# Altium footprint library RevA2.PcbLib: 57 footprints (part 2 of 4)
Each footprint in its own frame and in the unit in brackets; x right, y up, seen from the top. Pads: shape width x height; smd on the part's side, far side on the other; paste and mask are expansions set on the pad; w line width, h text height; cw(c..) or ccw(c..) is an arc to the next point about the centre after c.
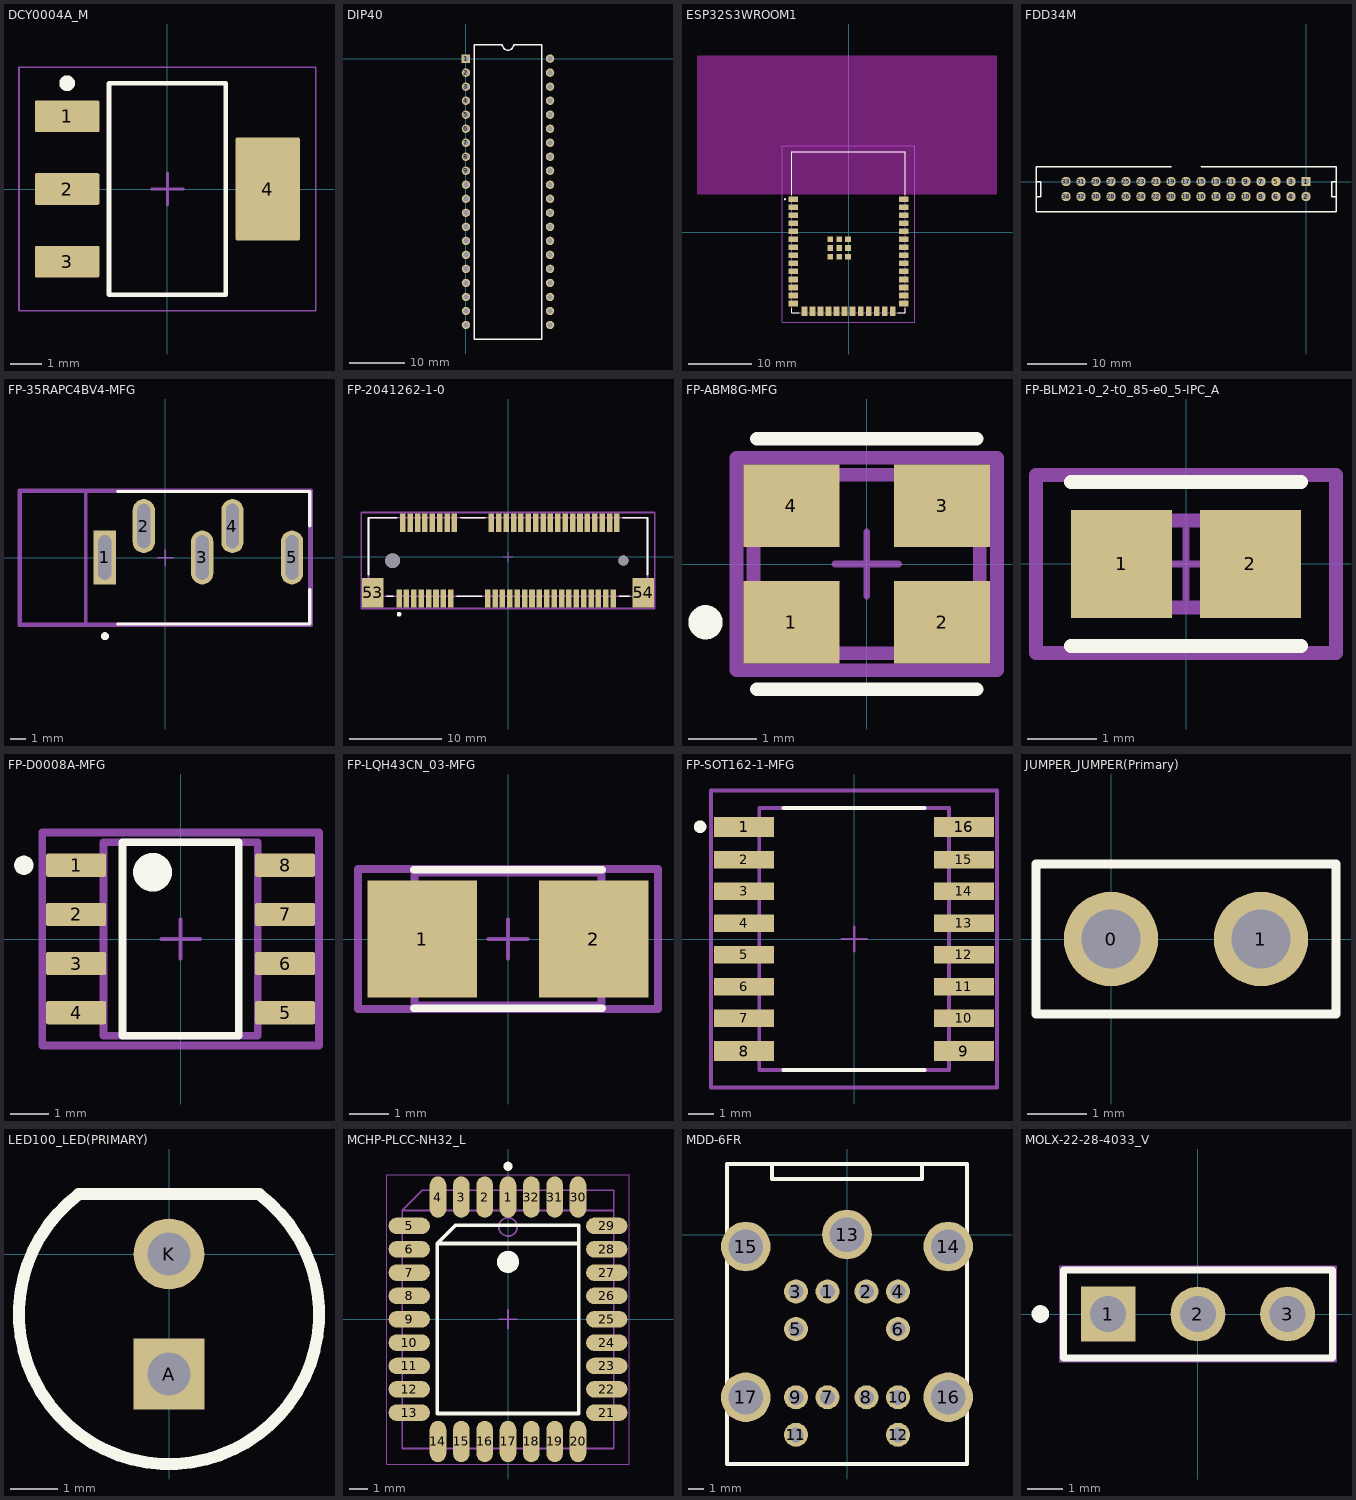
[diagram p1: the footprints below, top view; thin cyan lines are the x and y axes]

## DCY0004A_M [mm] "SOT223, 4-Leads, Body 6.7x3.7mm, Pitch 2.3mm, IPC Low Density"
height 1.8
pads (4):
  rrect10% 2.05x1 smd: 1(-3.175,2.3) 2(-3.175,0) 3(-3.175,-2.3)
  rrect5% 2.05x3.25 smd: 4(3.175,0)
Top Overlay:
  circle w0.25: c-3.175,3.35 r0.125
  lines w0.15: -1.85,-3.35 1.85,-3.35 1.85,3.35 -1.85,3.35 -1.85,-3.35
Mechanical 1:
  text ".Designator" at 0,0 h0.8
Mechanical 13:
  lines w0.1: -1.85,-3.35 1.85,-3.35 1.85,3.35 -1.85,3.35 -1.85,-3.35
Mechanical 15:
  lines w0.05: -4.7,-3.85 4.7,-3.85 4.7,3.85 -4.7,3.85 -4.7,-3.85
  lines w0.1: -0.5,0 0.5,0 ; 0,-0.5 0,0.5
3D body "SOT-223.stp": height 1.62, standoff -0.03, extent -3.5,-3.25 3.5,3.25

## DIP40 [mil]
pads (40):
  rect 60x60 hole 38: 1(0,0)
  round 60 hole 38: 2(0,-100) 3(0,-200) 4(0,-300) 5(0,-400) 6(0,-500) 7(0,-600) 8(0,-700) 9(0,-800) 10(0,-900) 11(0,-1000) 12(0,-1100) 13(0,-1200) 14(0,-1300) 15(0,-1400) 16(0,-1500) 17(0,-1600) 18(0,-1700) 19(0,-1800) 20(0,-1900) 21(600,-1900) 22(600,-1800) 23(600,-1700) 24(600,-1600) 25(600,-1500) 26(600,-1400) 27(600,-1300) 28(600,-1200) 29(600,-1100) 30(600,-1000) 31(600,-900) 32(600,-800) 33(600,-700) 34(600,-600) 35(600,-500) 36(600,-400) 37(600,-300) 38(600,-200) 39(600,-100) 40(600,0)
Top Overlay:
  lines w10: 60,-2000 540,-2000 540,100 340,100 cw(c300,100) 260,100 60,100 60,-2000
Top Value:
  text ".Value" at 199.06,-445.74 h118.11
3D body "c-3-1571552-2-e-3d.stp": height 177.17, standoff -112.83, extent -48.78,-1946.82 647.22,49.18

## ESP32S3WROOM1 [mm]
pads (49):
  rect 1.5x0.9 smd: 1(-8.75,5.26) 2(-8.75,3.99) 3(-8.75,2.72) 4(-8.75,1.45) 5(-8.75,0.18) 6(-8.75,-1.09) 7(-8.75,-2.36) 8(-8.75,-3.63) 9(-8.75,-4.9) 10(-8.75,-6.17) 11(-8.75,-7.44) 12(-8.75,-8.71) 13(-8.75,-9.98) 14(-8.75,-11.25) 27(8.75,-11.25) 28(8.75,-9.98) 29(8.75,-8.71) 30(8.75,-7.44) 31(8.75,-6.17) 32(8.75,-4.9) 33(8.75,-3.63) 34(8.75,-2.36) 35(8.75,-1.09) 36(8.75,0.18) 37(8.75,1.45) 38(8.75,2.72) 39(8.75,3.99) 40(8.75,5.26)
  rect 0.9x1.5 smd: 15(-6.985,-12.5) 16(-5.715,-12.5) 17(-4.445,-12.5) 18(-3.175,-12.5) 19(-1.905,-12.5) 20(-0.635,-12.5) 21(0.635,-12.5) 22(1.905,-12.5) 23(3.175,-12.5) 24(4.445,-12.5) 25(5.715,-12.5) 26(6.985,-12.5)
  rect 0.9x0.9 smd: EPAD(-2.9,-3.86) EPAD(-2.9,-2.46) EPAD(-2.9,-1.06) EPAD(-1.5,-3.86) EPAD(-1.5,-2.46) EPAD(-1.5,-1.06) EPAD(-0.1,-3.86) EPAD(-0.1,-2.46) EPAD(-0.1,-1.06)
Top Overlay:
  lines w0.15: -9,-12 -9,-12.75 -7.8,-12.75 ; -9,6 -9,12.75 9,12.75 9,6 ; 7.8,-12.75 9,-12.75 9,-12
  lines w0.2: -10.1,5.26 ccw(c-10.05,5.26) -10,5.26 ; -10.1,5.26 cw(c-10.05,5.26) -10,5.26 ; -10.1,5.26 ccw(c-10.05,5.26) -10,5.26
Keep-Out Layer:
  rectangle: -24,6 23.5,28
Mechanical 13:
  lines w0.1: -9,-12.75 9,-12.75 9,12.75 -9,12.75 -9,-12.75
Mechanical 15:
  lines w0.1: -10.5,-14.25 10.5,-14.25 10.5,13.75 -10.5,13.75 -10.5,-14.25
3D body "esp-wroom-32.step": height 3, standoff -0.04, extent -9.035,-12.753 9.035,12.787

## FDD34M [mm]
pads (34):
  rect 1.6x1.6 hole 1.1: 1(0,0)
  round 1.6 hole 1.1: 2(0,-2.54) 3(-2.54,0) 4(-2.54,-2.54) 6(-5.08,-2.54) 7(-7.62,0) 8(-7.62,-2.54) 9(-10.16,0) 10(-10.16,-2.54) 11(-12.7,0) 12(-12.7,-2.54) 13(-15.24,0) 14(-15.24,-2.54) 15(-17.78,0) 16(-17.78,-2.54) 17(-20.32,0) 18(-20.32,-2.54) 19(-22.86,0) 20(-22.86,-2.54) 21(-25.4,0) 22(-25.4,-2.54) 23(-27.94,0) 24(-27.94,-2.54) 25(-30.48,0) 26(-30.48,-2.54) 27(-33.02,0) 28(-33.02,-2.54) 29(-35.56,0) 30(-35.56,-2.54) 31(-38.1,0) 32(-38.1,-2.54) 33(-40.64,0) 34(-40.64,-2.54)
  round 1.6 smd: 5(-5.08,0)
Top Overlay:
  lines w0.254: -45.72,-2.54 -44.958,-2.54 -44.958,0 -45.72,0 ; -22.86,2.54 -45.72,2.54 -45.72,-5.08 5.08,-5.08 5.08,2.54 -17.78,2.54 ; 5.08,-2.54 4.318,-2.54 4.318,0 5.08,0
3D body "IDC-34MS CONNFLY.step": height 9.1, standoff -3.5, extent -45.81,-5.67 5.17,3.23

## FP-35RAPC4BV4-MFG [mm]
height 0.5
pads (5):
  rect 1.4x3.4 hole 2.8 slot 0.8 at 0 deg paste-1000 mask+0: 1(-3.81,0.013)
  rrect100% 1.4x3.4 hole 2.8 slot 0.8 at 0 deg paste-1000 mask+0: 2(-1.346,1.994) 3(2.337,0.013) 4(4.242,1.994) 5(8.001,0.013)
Top Overlay:
  circle w0.25: c-3.8,-4.95 r0.125
  lines w0.2: -3,-4.178 9.119,-4.178 9.119,-2 ; -3,4.178 9.119,4.178 9.119,2
Top 3D Body:
  lines w0.2: -5.004,-4.278 -5.004,4.278 ; -9.119,-4.178 9.119,-4.178 9.119,4.178 -9.119,4.178 -9.119,-4.178
Top Courtyard:
  lines w0.2: -9.219,-4.278 9.219,-4.278 9.219,4.278 -9.219,4.278 -9.219,-4.278
Top Assembly:
  lines w0.2: -9.219,-4.278 9.219,-4.278 9.219,4.278 -9.219,4.278 -9.219,-4.278
  text ".Designator" at 0,0.188 h1
Top Component Center:
  lines w0.1: -0.5,0 0.5,0 ; 0,-0.5 0,0.5
3D body "Conn_Switchcraft_35RAPC4BV4_eec.STEP": height 0.25, standoff 0, extent -9.219,-4.278 9.219,4.278

## FP-2041262-1-0 [mm]
height 9.9
pads (56):
  rect 0.6x2 smd paste+0 mask+0: 1(-11.8,-4.5) 2(-11.4,3.7) 3(-11,-4.5) 4(-10.6,3.7) 5(-10.2,-4.5) 6(-9.8,3.7) 7(-9.4,-4.5) 8(-9,3.7) 9(-8.6,-4.5) 10(-8.2,3.7) 11(-7.8,-4.5) 12(-7.4,3.7) 13(-7,-4.5) 14(-6.6,3.7) 15(-6.2,-4.5) 16(-5.8,3.7) 17(-2.2,-4.5) 18(-1.8,3.7) 19(-1.4,-4.5) 20(-1,3.7) 21(-0.6,-4.5) 22(-0.2,3.7) 23(0.2,-4.5) 24(0.6,3.7) 25(1,-4.5) 26(1.4,3.7) 27(1.8,-4.5) 28(2.2,3.7) 29(2.6,-4.5) 30(3,3.7) 31(3.4,-4.5) 32(3.8,3.7) 33(4.2,-4.5) 34(4.6,3.7) 35(5,-4.5) 36(5.4,3.7) 37(5.8,-4.5) 38(6.2,3.7) 39(6.6,-4.5) 40(7,3.7) 41(7.4,-4.5) 42(7.8,3.7) 43(8.2,-4.5) 44(8.6,3.7) 45(9,-4.5) 46(9.4,3.7) 47(9.8,-4.5) 48(10.2,3.7) 49(10.6,-4.5) 50(11,3.7) 51(11.4,-4.5) 52(11.8,3.7)
  rect 2.3x3.2 smd paste+0 mask+0: 53(-14.65,-3.9) 54(14.65,-3.9)
  round 1.6 hole 1.6 unplated paste-1000 mask+0: ""(-12.5,-0.4)
  round 1.1 hole 1.1 unplated paste-1000 mask+0: ""(12.5,-0.4)
Top Overlay:
  circle w0.25: c-11.8,-6.2 r0.125
  lines w0.2: -15.1,-1.925 -15.1,4.25 -12.075,4.25 ; -13.125,-4.25 -12.475,-4.25 ; -5.525,-4.25 -2.875,-4.25 ; -5.125,4.25 -2.475,4.25 ; 12.075,-4.25 13.125,-4.25 ; 12.475,4.25 15.1,4.25 15.1,-1.925
Top 3D Body:
  lines w0.2: -15.1,-4.25 -15.1,4.25 15.1,4.25 15.1,-4.25 -15.1,-4.25
Top Courtyard:
  lines w0.2: -15.9,-5.6 -15.9,4.8 15.9,4.8 15.9,-5.6 -15.9,-5.6
Top Assembly:
  lines w0.2: -15.9,-5.6 -15.9,4.8 15.9,4.8 15.9,-5.6 -15.9,-5.6
  text ".Designator" at 0,-0.212 h1
Top Component Center:
  lines w0.1: -0.5,0 0.5,0 ; 0,-0.5 0,0.5
3D body "Conn_TE_Connectivity_2041262-1_eec.STEP": height 0.25, standoff 0, extent -15.9,-5.6 15.9,4.8

## FP-ABM8G-MFG [mm]
pads (4):
  rect 1.4x1.2 smd paste+0 mask+0: 1(-1.1,-0.85) 2(1.1,-0.85) 3(1.1,0.85) 4(-1.1,0.85)
Top Overlay:
  circle w0.25: c-2.35,-0.85 r0.125
  lines w0.2: -1.6,-1.825 1.6,-1.825 ; -1.6,1.825 1.6,1.825
Top 3D Body:
  lines w0.2: -1.65,-1.3 1.65,-1.3 1.65,1.3 -1.65,1.3 -1.65,-1.3
Top Courtyard:
  lines w0.2: -1.9,-1.55 1.9,-1.55 1.9,1.55 -1.9,1.55 -1.9,-1.55
Top Assembly:
  lines w0.2: -1.9,-1.55 1.9,-1.55 1.9,1.55 -1.9,1.55 -1.9,-1.55
  text ".Designator" at 0,0.188 h1
Top Component Center:
  lines w0.1: -0.465,0 0.465,0 ; 0,-0.465 0,0.465
3D body "Crys_Abracon_ABM8G-25_000MHz-B4Y-T_eec.STEP": height 0.25, standoff 0, extent -1.9,-1.55 1.9,1.55

## FP-BLM21-0_2-t0_85-e0_5-IPC_A [mm]
pads (2):
  rect 1.455x1.556 smd paste+0 mask+0: 1(-0.926,0) 2(0.926,0)
Top Overlay:
  lines w0.2: -1.653,-1.178 1.653,-1.178 ; -1.653,1.178 1.653,1.178
Top Value:
  text ".Value" at 1.937,-1.606 h1.25
Top 3D Body:
  lines w0.2: -1,-0.625 -1,0.625 1,0.625 1,-0.625 -1,-0.625
Top Courtyard:
  lines w0.2: -2.153,-1.278 -2.153,1.278 2.153,1.278 2.153,-1.278 -2.153,-1.278
Top Assembly:
  lines w0.2: -2.153,-1.278 -2.153,1.278 2.153,1.278 2.153,-1.278 -2.153,-1.278
  text ".Value" at 0,0.011 h1
Top Component Center:
  lines w0.1: -0.5,0 0.5,0 ; 0,-0.5 0,0.5
3D body "FBead_Murata_BLM21AG102SN1D_eec.STEP": height 1.05, standoff 0, extent -1,-0.625 1,0.625

## FP-D0008A-MFG [mm]
height 5.27
pads (8):
  rrect17% 1.55x0.6 smd paste+0 mask+0: 1(-2.7,1.905) 2(-2.7,0.635) 3(-2.7,-0.635) 4(-2.7,-1.905) 5(2.7,-1.905) 6(2.7,-0.635) 7(2.7,0.635) 8(2.7,1.905)
Top Overlay:
  circle w0.5: c-0.725,1.725 r0.25
  circle w0.25: c-4.05,1.905 r0.125
  lines w0.2: -1.5,-2.5 -1.5,2.5 1.5,2.5 1.5,-2.5 -1.5,-2.5
Top Value:
  text ".Value" at -0.013,1.429 h1.2
Top 3D Body:
  lines w0.2: -1.99,-2.5 -1.99,2.5 1.99,2.5 1.99,-2.5 -1.99,-2.5
Top Courtyard:
  lines w0.2: -3.575,-2.75 -3.575,2.75 3.575,2.75 3.575,-2.75 -3.575,-2.75
Top Assembly:
  lines w0.2: -3.575,-2.75 -3.575,2.75 3.575,2.75 3.575,-2.75 -3.575,-2.75
  text ".Designator" at 0,0.188 h1
Top Component Center:
  lines w0.1: -0.5,0 0.5,0 ; 0,-0.5 0,0.5
3D body "IC_Texas_Instruments_ISO7220ADR_eec.STEP": height 0.25, standoff 0, extent -3.575,-2.75 3.575,2.75

## FP-LQH43CN_03-MFG [mm]
height 1.5
pads (2):
  rect 2.8x3 smd paste+0 mask+0: 1(-2.2,0) 2(2.2,0)
Top Overlay:
  lines w0.2: -2.413,-1.778 2.413,-1.778 ; -2.413,1.778 2.413,1.778
Top 3D Body:
  lines w0.2: -2.4,-1.7 2.4,-1.7 2.4,1.7 -2.4,1.7 -2.4,-1.7
Top Courtyard:
  lines w0.2: -3.85,-1.8 3.85,-1.8 3.85,1.8 -3.85,1.8 -3.85,-1.8
Top Assembly:
  lines w0.2: -3.85,-1.8 3.85,-1.8 3.85,1.8 -3.85,1.8 -3.85,-1.8
  text ".Designator" at 0,0 h1
Top Component Center:
  lines w0.1: -0.5,0 0.5,0 ; 0,-0.5 0,0.5
3D body "Ind_Murata_LQH43MN3R3M03L_eec.STEP": height 0.25, standoff 0, extent -3.85,-1.8 3.85,1.8

## FP-SOT162-1-MFG [mm]
height 1.5
pads (16):
  rect 2.4x0.8 smd paste+0 mask+0: 1(-4.4,4.495) 8(-4.4,-4.495) 9(4.4,-4.495) 16(4.4,4.495)
  rect 2.4x0.7 smd paste+0 mask+0: 2(-4.4,3.175) 3(-4.4,1.905) 4(-4.4,0.635) 5(-4.4,-0.635) 6(-4.4,-1.905) 7(-4.4,-3.175) 10(4.4,-3.175) 11(4.4,-1.905) 12(4.4,-0.635) 13(4.4,0.635) 14(4.4,1.905) 15(4.4,3.175)
Top Overlay:
  circle w0.25: c-6.165,4.495 r0.125
  lines w0.15: -2.825,-5.25 2.825,-5.25 ; -2.825,5.25 2.825,5.25
Top Value:
  text ".Value" at 1.159,1.689 h1.4
Top 3D Body:
  lines w0.15: -3.8,-5.25 3.8,-5.25 3.8,5.25 -3.8,5.25 -3.8,-5.25
Top Courtyard:
  lines w0.15: -5.725,-5.95 5.725,-5.95 5.725,5.95 -5.725,5.95 -5.725,-5.95
Top Assembly:
  lines w0.15: -5.725,-5.95 5.725,-5.95 5.725,5.95 -5.725,5.95 -5.725,-5.95
  text ".Designator" at 0,0.188 h1
Top Component Center:
  lines w0.1: -0.5,0 0.5,0 ; 0,-0.5 0,0.5
3D body "IC_NXP_Semiconductors_PCF8574T-3_518_eec.STEP": height 0.25, standoff 0, extent -5.725,-5.95 5.725,5.95

## JUMPER_JUMPER(Primary) [mm]
pads (2):
  round 1.6 hole 1: 0(0,0) 1(2.54,0)
Top Overlay:
  lines w0.15: -1.27,-1.27 -1.27,1.27 3.81,1.27 3.81,-1.27 -1.27,-1.27
3D body "User Library-PLS2.STEP": height 8.54, standoff -3, extent -1.27,-1.27 3.81,1.27

## LED100_LED(PRIMARY) [mm]
pads (2):
  rect 1.5x1.5 hole 0.9: A(0,-2.54)
  round 1.5 hole 0.9: K(0,0)
Top Overlay:
  lines w0.254: -1.911,1.266 ccw(c0,-1.27) 1.911,1.266 ; -1.905,1.27 1.905,1.27
3D body "User Library-PLS2.STEP": height 8.54, standoff -3, extent -1.27,-3.81 1.27,1.27

## MCHP-PLCC-NH32_L [mm] "PLCC, 32-Leads, Body 13.97x11.43mm, Pitch 1.27mm, IPC High Density"
height 3.56
pads (32):
  oval 0.9x2.25 smd: 1(0,6.65) 2(-1.27,6.65) 3(-2.54,6.65) 4(-3.81,6.65) 14(-3.81,-6.65) 15(-2.54,-6.65) 16(-1.27,-6.65) 17(0,-6.65) 18(1.27,-6.65) 19(2.54,-6.65) 20(3.81,-6.65) 30(3.81,6.65) 31(2.54,6.65) 32(1.27,6.65)
  oval 2.25x0.9 smd: 5(-5.375,5.08) 6(-5.375,3.81) 7(-5.375,2.54) 8(-5.375,1.27) 9(-5.375,0) 10(-5.375,-1.27) 11(-5.375,-2.54) 12(-5.375,-3.81) 13(-5.375,-5.08) 21(5.375,-5.08) 22(5.375,-3.81) 23(5.375,-2.54) 24(5.375,-1.27) 25(5.375,0) 26(5.375,1.27) 27(5.375,2.54) 28(5.375,3.81) 29(5.375,5.08)
Top Overlay:
  circle w0.25: c0,8.325 r0.125
  circle w0.6: c0,3.125 r0.3
  lines w0.2: 3.85,4.125 -3.85,4.125 ; -3.85,4.125 -2.85,5.125 3.85,5.125 3.85,-5.125 -3.85,-5.125 -3.85,4.125
Top Value:
  text "SST39SF040" at -3.101,3.725 h1.5
Mechanical 13:
  circle w0.1: c0,5.025 r0.5
  lines w0.1: 5.755,5.925 -5.755,5.925 ; -5.755,5.925 -5.755,-7.025 5.755,-7.025 5.755,7.025 -4.655,7.025 -5.755,5.925
Mechanical 15:
  lines w0.05: -6.6,-7.875 -6.6,7.875 6.6,7.875 6.6,-7.875 -6.6,-7.875
  lines w0.1: -0.5,0 0.5,0 ; 0,-0.5 0,0.5
3D body "User Library-PLCC32.STEP": height 2.89, standoff -0.4, extent -6.25,-7.453 6.25,7.453

## MDD-6FR [mm]
pads (17):
  round 1.6 hole 1: 1(-1.3,-3.8) 2(1.3,-3.8) 3(-3.4,-3.8) 4(3.4,-3.8) 5(-3.4,-6.3) 6(3.4,-6.3) 7(-1.3,-10.85) 8(1.3,-10.85) 9(-3.4,-10.85) 10(3.4,-10.85) 11(-3.4,-13.35) 12(3.4,-13.35)
  round 3.3 hole 2.3: 13(0,0) 14(6.75,-0.8) 15(-6.75,-0.8) 16(6.75,-10.85) 17(-6.75,-10.85)
Top Overlay:
  lines w0.254: -5,4.7 -5,3.7 5,3.7 5,4.7 ; -8,-15.3 -8,4.7 8,4.7 8,-15.3 -8,-15.3
3D body "1734021-4.stp": height 28.5, standoff -3.65, extent -7.211,-15.207 7.239,4.793

## MOLX-22-28-4033_V [mm] "THD, 3-Leads, Body 7.62x2.49mm, Pitch 2.54mm"
height 8.38
pads (3):
  rect 1.55x1.55 hole 1.02: 1(-2.54,0)
  round 1.55 hole 1.02: 2(0,0) 3(2.54,0)
Top Overlay:
  circle w0.25: c-4.46,0 r0.125
  lines w0.2: -3.81,-1.245 -3.81,1.245 3.81,1.245 3.81,-1.245 -3.81,-1.245
Mechanical 13:
  lines w0.1: -3.81,-1.245 -3.81,1.245 3.81,1.245 3.81,-1.245 -3.81,-1.245
Mechanical 15:
  lines w0.05: -3.91,-1.345 3.91,-1.345 3.91,1.345 -3.91,1.345 -3.91,-1.345
  lines w0.1: -0.5,0 0.5,0 ; 0,-0.5 0,0.5
3D body "022284033.stp": height 8.38, standoff -3.18, extent -3.81,-1.245 3.81,1.245